# Altium footprint library Nanjar's Library.PcbLib: 153 footprints (part 8 of 10)
Each footprint in its own frame and in the unit in brackets; x right, y up, seen from the top. Pads: shape width x height; smd on the part's side, far side on the other; paste and mask are expansions set on the pad; w line width, h text height; cw(c..) or ccw(c..) is an arc to the next point about the centre after c.
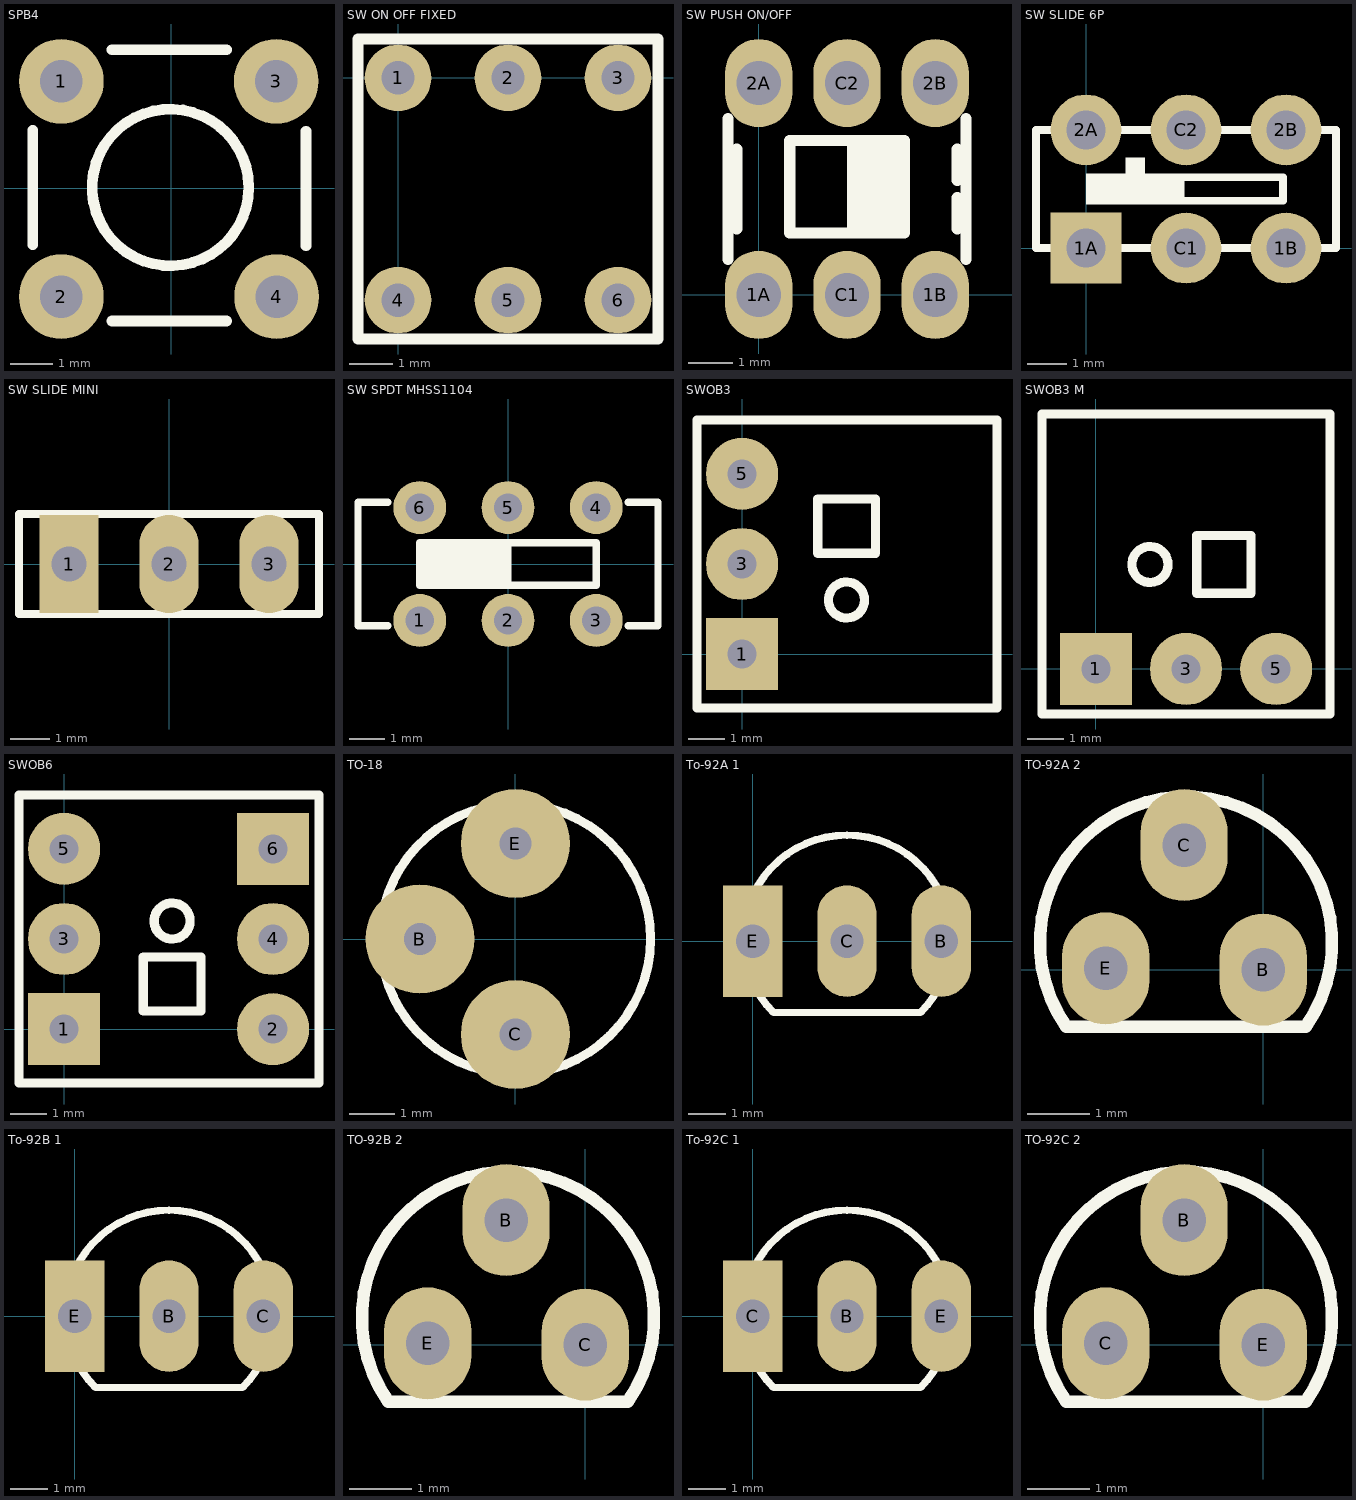
[diagram p7: the footprints below, top view; thin cyan lines are the x and y axes]

## SPB4 [mm]
pads (4):
  round 2 hole 1: 1(-2.597,2.528) 2(-2.597,-2.552) 3(2.473,2.528) 4(2.483,-2.552)
Top Overlay:
  circle w0.254: c-0.023,0.025 r1.848
  lines w0.254: -3.275,-1.325 -3.275,1.375 ; -1.4,-3.125 1.3,-3.125 ; -1.4,3.275 1.3,3.275 ; 3.175,-1.35 3.175,1.35

## SW ON OFF FIXED [mil]
pads (6):
  round 60 hole 30: 1(0,0) 2(99,0) 3(198,0) 4(0,-200) 5(99,-200) 6(198,-200)
Top Overlay:
  lines w10: -36,-235 234,-235 234,35 209,35 109,35 -36,35 -36,-235
3D body "User Library-button with fixation.STEP": height 511.81, standoff -157.48, extent -37.8,-236.59 237.8,39

## SW PUSH ON/OFF [mm]
pads (6):
  oval 1.524x2 hole 1: 1A(0,0) 1B(4,0) 2A(0,4.8) 2B(4,4.8) C1(2,0) C2(2,4.8)
Top Overlay:
  rectangle: 2,1.5 3.2,3.5
  lines w0.254: -0.7,0.8 -0.7,4 ; -0.5,1.5 -0.5,3.3 ; 4.5,1.5 4.5,2.2 ; 4.5,2.6 4.5,3.3 ; 4.7,0.8 4.7,4 ; 0.7,1.4 3.3,1.4 3.3,3.5 0.7,3.5 0.7,1.4

## SW SLIDE 6P [mm] "Connector; Header; 3x2 Position"
height 2.032
pads (6):
  rect 1.8x1.8 hole 1: 1A(0,0)
  round 1.8 hole 1: 1B(5.08,0) 2A(0,3) 2B(5.08,3) C1(2.54,0) C2(2.54,3)
Top Overlay:
  rectangle: 1,1.5 1.5,2.3
  rectangle: 0,1.1 2.5,1.9
  lines w0.2: 2.4,1.8 5,1.8 5,1.2 2.5,1.2 ; -1.27,0 6.35,0 6.35,3 -1.27,3 -1.27,0

## SW SLIDE MINI [mm]
pads (3):
  rect 1.5x2.5 hole 0.9: 1(-2.54,0)
  oval 1.5x2.5 hole 0.9: 2(0,0) 3(2.54,0)
Top Overlay:
  lines w0.2: -3.81,-1.27 -3.81,1.27 3.81,1.27 3.81,-1.27 -3.81,-1.27
3D body "User Library-Mini Slide Switch-3Ppin-SPDT-0_3A.STEP": height 6.8, standoff -4.7, extent -4.25,-1.85 4.25,1.85

## SW SPDT MHSS1104 [mm] "Micro Sliding Switch pitch 2.5mm"
pads (6):
  round 1.5 hole 0.8: 1(-2.5,-1.6) 2(0,-1.6) 3(2.5,-1.6) 4(2.5,1.6) 5(0,1.6) 6(-2.5,1.6)
Top Overlay:
  rectangle: -2.5,-0.5 0.1,0.5
  lines w0.203: -3.4,-1.75 -4.25,-1.75 -4.25,1.75 -3.4,1.75 ; 3.4,-1.75 4.25,-1.75 4.25,1.75 3.4,1.75 ; -2.5,-0.6 -2.5,0.6 2.5,0.6 2.5,-0.6 -2.5,-0.6
3D body "User Library-Mini Switch.step": height 5.41, standoff -1.8, extent -4.1,-1.71 4.1,1.71

## SWOB3 [mm]
pads (3):
  rect 2x2 hole 0.8: 1(0,0)
  round 2 hole 0.8: 3(0,2.5) 5(0,5)
Top Overlay:
  circle w0.254: c2.9,1.5 r0.5
  lines w0.254: -1.25,-1.5 7.075,-1.5 7.075,6.5 -1.25,6.5 -1.25,-1.5 ; 2.1,2.8 2.1,4.3 3.7,4.3 3.7,2.8 2.1,2.8

## SWOB3 M [mm]
pads (3):
  rect 2x2 hole 0.8: 1(0,0)
  round 2 hole 0.8: 3(2.5,0) 5(5,0)
Top Overlay:
  circle w0.254: c1.5,2.9 r0.5
  lines w0.254: -1.5,-1.25 6.5,-1.25 6.5,7.075 -1.5,7.075 -1.5,-1.25 ; 2.8,2.1 2.8,3.7 4.3,3.7 4.3,2.1 2.8,2.1

## SWOB6 [mm]
pads (6):
  rect 2x2 hole 0.8: 1(0,0) 6(5.8,5)
  round 2 hole 0.8: 2(5.8,0) 3(0,2.5) 4(5.8,2.5) 5(0,5)
Top Overlay:
  circle w0.254: c3,3 r0.5
  lines w0.254: -1.25,-1.5 -1.25,6.5 7.075,6.5 7.075,-1.5 -1.25,-1.5 ; 2.2,0.5 3.8,0.5 3.8,2 2.2,2 2.2,0.5

## TO-18 [mm]
pads (3):
  round 2.4 hole 0.7: B(-2.1,0) C(0,-2.1) E(0,2.1)
Top Overlay:
  circle w0.2: c0,0 r2.973
3D body "User Library-TO-18_2N2222.STEP": height 6.8, standoff -1.59, extent -2.8,-2.8 2.808,2.808

## To-92A 1 [mm]
pads (3):
  oval 1.6x3 hole 0.9: B(5.08,0) C(2.54,0)
  rect 1.6x3 hole 0.9: E(0,0)
Top Overlay:
  lines w0.2: 0.56,-1.924 cw(c2.54,0.056) 4.52,-1.924 0.56,-1.924
3D body "TO-92-1.STEP": height 1, standoff -6.7, extent -0.19,-1.621 5.39,2.35

## TO-92A 2 [mm]
pads (3):
  oval 1.4x1.8 hole 0.7: B(0,0) C(-1.27,2) E(-2.53,0.02)
Top Overlay:
  lines w0.2: -3.16,-0.92 cw(c-1.24,0.43) 0.68,-0.92 0.51,-0.92 -2.99,-0.92 -3.16,-0.92
3D body "User Library-TO-92-3.STEP": height 7.93, standoff -4.4, extent -3.93,-1.48 1.39,2.68

## To-92B 1 [mm]
pads (3):
  oval 1.6x3 hole 0.9: B(2.54,0) C(5.08,0)
  rect 1.6x3 hole 0.9: E(0,0)
Top Overlay:
  lines w0.2: 0.56,-1.924 cw(c2.54,0.056) 4.52,-1.924 0.56,-1.924
3D body "TO-92-1.STEP": height 1, standoff -6.7, extent -0.19,-1.621 5.39,2.35

## TO-92B 2 [mm]
pads (3):
  oval 1.4x1.8 hole 0.7: B(-1.27,2) C(0,0) E(-2.53,0.02)
Top Overlay:
  lines w0.2: -3.16,-0.92 cw(c-1.24,0.43) 0.68,-0.92 0.51,-0.92 -2.99,-0.92 -3.16,-0.92
3D body "User Library-TO-92-3.STEP": height 7.93, standoff -4.4, extent -3.93,-1.48 1.39,2.68

## To-92C 1 [mm]
pads (3):
  oval 1.6x3 hole 0.9: B(2.54,0) E(5.08,0)
  rect 1.6x3 hole 0.9: C(0,0)
Top Overlay:
  lines w0.2: 0.56,-1.924 cw(c2.54,0.056) 4.52,-1.924 0.56,-1.924
3D body "TO-92-1.STEP": height 1, standoff -6.7, extent -0.19,-1.621 5.39,2.35

## TO-92C 2 [mm]
pads (3):
  oval 1.4x1.8 hole 0.7: B(-1.27,2) C(-2.53,0.02) E(0,0)
Top Overlay:
  lines w0.2: -3.16,-0.92 cw(c-1.24,0.43) 0.68,-0.92 0.51,-0.92 -2.99,-0.92 -3.16,-0.92
3D body "User Library-TO-92-3.STEP": height 7.93, standoff -4.4, extent -3.93,-1.48 1.39,2.68